# Altium footprint library En.PcbLib: 240 footprints (part 9 of 15)
Each footprint in its own frame and in the unit in brackets; x right, y up, seen from the top. Pads: shape width x height; smd on the part's side, far side on the other; paste and mask are expansions set on the pad; w line width, h text height; cw(c..) or ccw(c..) is an arc to the next point about the centre after c.
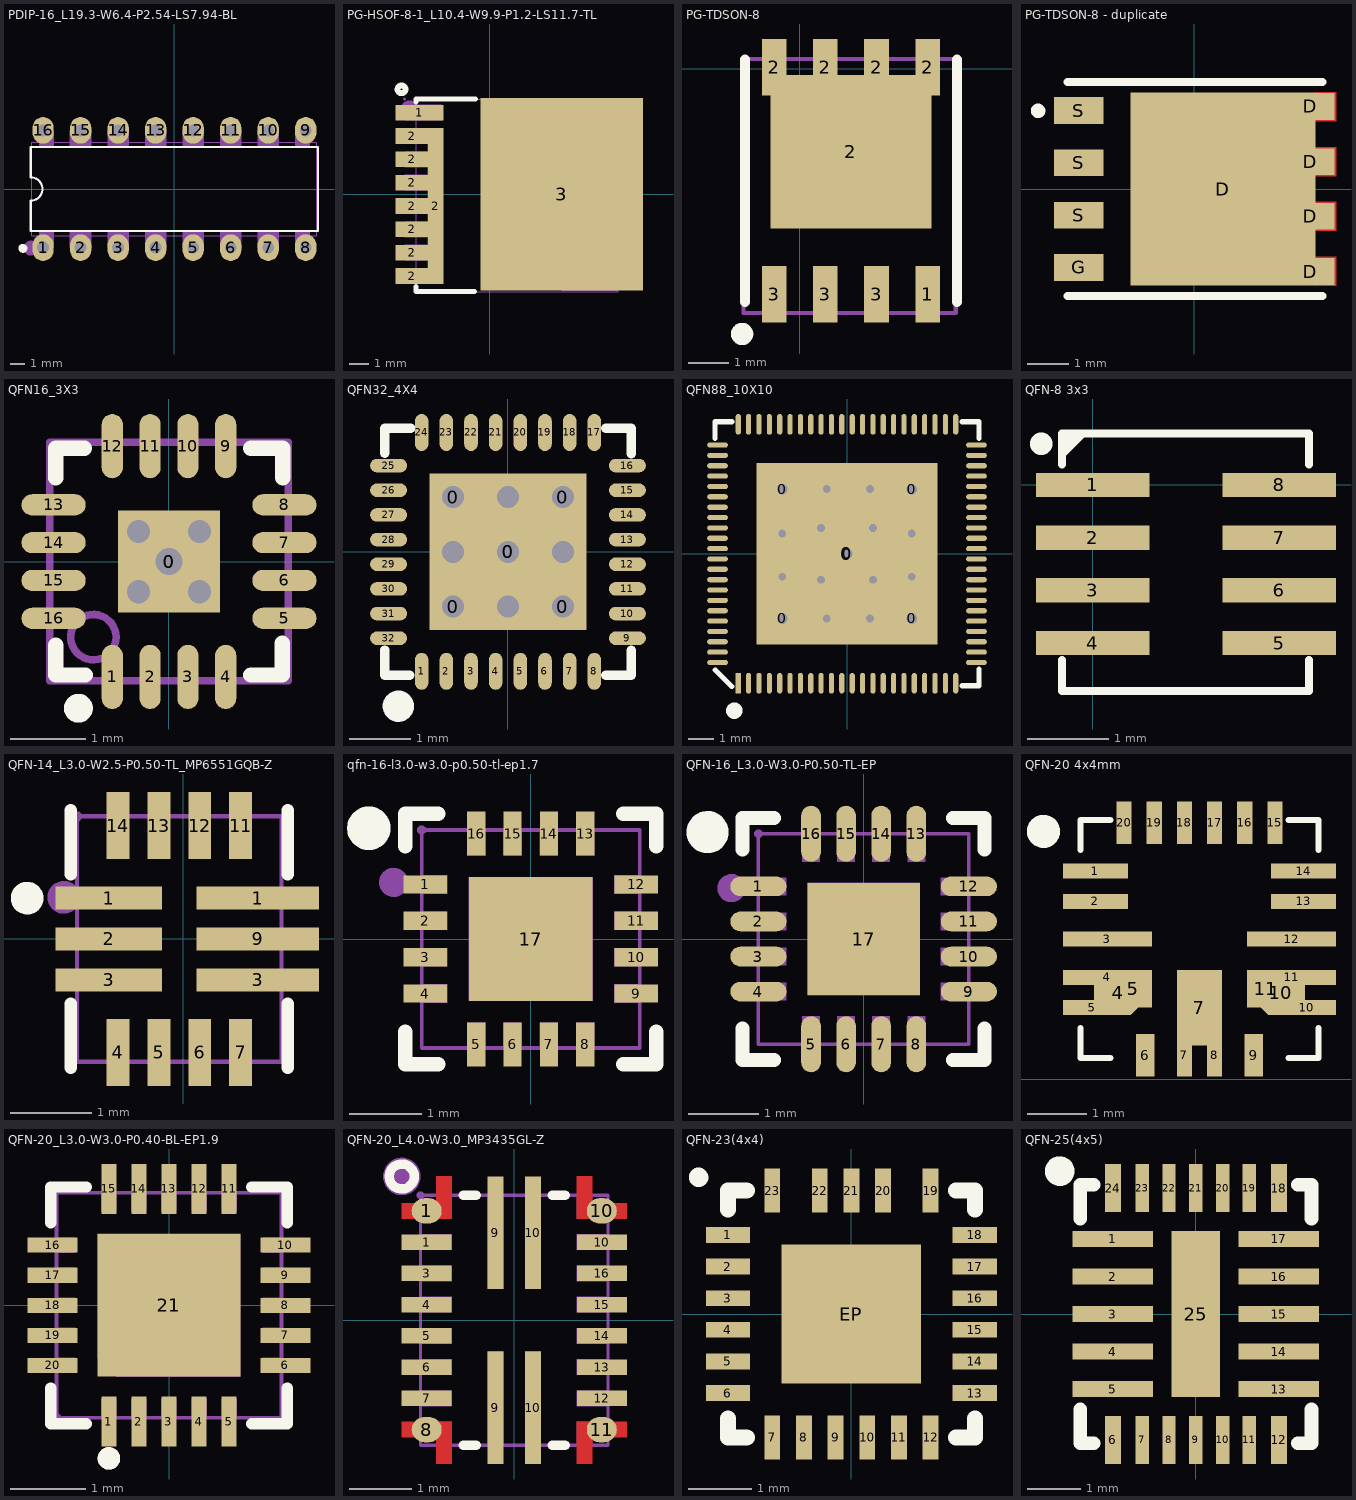
[diagram p8: the footprints below, top view; thin cyan lines are the x and y axes]

## PDIP-16_L19.3-W6.4-P2.54-LS7.94-BL [mm]
pads (16):
  oval 1.44x1.8 hole 0.8: 1(-8.89,-3.97) 2(-6.35,-3.97) 3(-3.81,-3.97) 4(-1.27,-3.97) 5(1.27,-3.97) 6(3.81,-3.97) 7(6.35,-3.97) 8(8.89,-3.97) 9(8.89,3.97) 10(6.35,3.97) 11(3.81,3.97) 12(1.27,3.97) 13(-1.27,3.97) 14(-3.81,3.97) 15(-6.35,3.97) 16(-8.89,3.97)
Top Overlay:
  circle w0.3: c-10.26,-4.02 r0.15
  lines w0.152: -9.729,-2.841 9.729,-2.841 9.729,2.841 -9.729,2.841 -9.729,0.794 cw(c-9.729,0) -9.729,-0.794 -9.729,-2.841
Mechanical 6:
  circle w0.5: c-9.71,-4 r0.25
Mechanical 15:
  drawing of 37 lines, arcs and shapes, not listed
3D body "sn74ls147n(lx).step": height 4.58, standoff -3.69, extent -9.65,-4.095 9.65,4.095

## PG-HSOF-8-1_L10.4-W9.9-P1.2-LS11.7-TL [mm]
pads (10):
  rect 2.463x0.8 smd paste-100 mask+0.051: 1(-3.619,4.2)
  rect 1.7x0.8 smd paste-100 mask+0.051: 2(-4,-4.2) 2(-4,-3) 2(-4,-1.8) 2(-4,-0.6) 2(-4,0.6) 2(-4,1.8) 2(-4,3)
  rect 0.8x8 smd paste-100 mask+0.051: 2(-2.788,-0.6)
  rect 8.382x9.9 smd paste-100 mask+0.051: 3(3.691,0)
Top Overlay:
  circle w0.3: c-4.55,5.4 r0.2
  lines w0.254: -3.8,-4.75 -3.8,-5 -0.8,-5 ; -3.8,4.75 -3.8,4.9 -0.75,4.9
Top Paste:
  region: -4.85,4.6 -2.4,4.6 -2.4,3.8 -4.85,3.8
  region: 8.5,4.95 8.5,-4.95 -0.5,-4.95 -0.5,4.95
  region: -4.85,3.4 -2.388,3.4 -2.388,-4.6 -4.85,-4.6 -4.85,-3.8 -3.187,-3.8 -3.187,-3.4 -4.85,-3.4 -4.85,-2.6 -3.188,-2.6 -3.188,-2.2 -4.85,-2.2 -4.85,-1.4 -3.187,-1.4 -3.187,-1 -4.85,-1 -4.85,-0.201 -4.85,-0.2 -3.187,-0.2 -3.187,0.2 -4.849,0.2 -4.85,0.201 -4.85,1 -3.187,1 -3.187,1.4 -4.85,1.4 -4.85,2.2 -3.187,2.2 -3.186,2.199 -3.186,2.598 -3.188,2.6 -4.85,2.6
Mechanical 6:
  circle w0.5: c-4.129,4.326 r0.25
Mechanical 15:
  region: -4.328,4.9 -4.328,4.925 -4.363,4.96 -4.413,4.96 -4.448,4.925 -4.448,4.9 -4.448,4.875 -4.413,4.84 -4.363,4.84 -4.328,4.875
  region: -4.388,3.8 -4.388,4.6 -2.488,4.6 -2.488,3.8
  region: -4.388,-4.6 -4.388,-3.8 -3.188,-3.8 -3.188,-4.6
  region: -4.388,-3.4 -4.388,-2.6 -3.188,-2.6 -3.188,-3.4
  region: -4.388,-2.2 -4.388,-1.4 -3.188,-1.4 -3.188,-2.2
  region: -4.388,0.2 -4.388,1 -3.188,1 -3.188,0.2
  region: -4.388,-1 -4.388,-0.2 -3.188,-0.2 -3.188,-1
  region: -4.388,1.4 -4.388,2.2 -3.188,2.2 -3.188,1.4
  region: -4.388,2.6 -4.388,3.4 -3.188,3.4 -3.188,2.6
  region: -3.188,3.4 -2.488,3.4 -2.488,-4.6 -3.188,-4.6
  region: 7.29,-4.9 7.29,-3.75 6.99,-3.75 6.99,-0.65 7.29,-0.65 7.29,0.65 6.99,0.65 6.99,3.75 7.29,3.75 7.29,4.9 3.69,4.9 3.69,4.55 0.39,4.55 0.39,-4.55 3.69,-4.55 3.69,-4.95 6.59,-4.95 6.59,-4.9
  lines w0.051: -3.8,-5.004 6.6,-5.004 6.6,4.896 -3.8,4.896 -3.8,-5.004
3D body "ipt020n10n5atma1.step": height 2.3, standoff -0.01, extent -4.263,-4.95 7.411,4.95

## PG-TDSON-8 [mm]
pads (9):
  rect 0.61x1.4 smd: 1(3.175,-5.588) 2(-0.635,0.044) 2(0.635,0.044) 2(1.905,0.044) 2(3.175,0.044) 3(-0.635,-5.588) 3(0.635,-5.588) 3(1.905,-5.588)
  rect 4x3.81 smd: 2(1.27,-2.056)
Top Overlay:
  circle w0.305: c-1.43,-6.572 r0.125
  lines w0.254: -1.36,-5.772 -1.36,0.228 ; 3.9,-5.772 3.9,0.228
Mechanical 13:
  lines w0.1: -1.39,-6.056 -1.39,0.244 3.87,0.244 3.87,-6.056 -1.39,-6.056
3D body "TDSON-8-1.stp": height 1.01, standoff 0, extent -1.425,-5.726 3.965,0.424

## PG-TDSON-8 - duplicate [mm]
pads (9):
  rect 4.5x4.7 smd: D(0.691,0)
  rect 1.2x0.65 smd: D(2.81,-2.007) D(2.81,-0.66) D(2.81,0.66) D(2.81,2.007) G(-2.809,-1.905) S(-2.809,-0.635) S(-2.809,0.635) S(-2.809,1.905)
Top Layer:
  region: 2.941,-0.315 2.941,-1.015 3.441,-1.015 3.441,-0.315
  region: 2.941,1.015 2.941,0.315 3.441,0.315 3.441,1.015
  region: 2.941,-1.65 2.941,-2.35 3.441,-2.35 3.441,-1.65
  region: 2.941,2.35 2.941,1.65 3.441,1.65 3.441,2.35
Top Overlay:
  circle w0.25: c-3.8,1.9 r0.05
  lines w0.2: -3.084,-2.6 3.116,-2.6 ; -3.084,2.6 3.116,2.6
3D body "TDSON-8-1.stp": height 1.01, standoff 0, extent -3.059,-2.695 3.091,2.695

## QFN16_3X3 [mm]
pads (18):
  rect 1.35x1.35 smd mask+0.051: 0(0,0)
  round 0.508 hole 0.356: 0(0,0)
  oval 0.28x0.85 smd mask+0.051: 1(-0.75,-1.526) 2(-0.25,-1.526) 3(0.25,-1.526) 4(0.75,-1.526) 9(0.75,1.526) 10(0.25,1.526) 11(-0.25,1.526) 12(-0.75,1.526)
  oval 0.85x0.28 smd mask+0.051: 5(1.526,-0.75) 6(1.526,-0.25) 7(1.526,0.25) 8(1.526,0.75) 13(-1.526,0.75) 14(-1.526,0.25) 15(-1.526,-0.25) 16(-1.526,-0.75)
via -0.405,-0.399 diameter 0.508 hole 0.305
via 0.405,-0.399 diameter 0.508 hole 0.305
via 0.405,0.399 diameter 0.508 hole 0.305
via -0.405,0.399 diameter 0.508 hole 0.305
Top Overlay:
  circle w0.229: c-1.198,-1.94 r0.076
  lines w0.203: -1.497,-1.108 -1.497,-1.5 -1.105,-1.5 ; -1.497,1.105 -1.497,1.5 -1.118,1.5 ; 1.079,-1.5 1.5,-1.5 1.5,-1.08 ; 1.082,1.5 1.503,1.5 1.503,1.108
Mechanical 13:
  circle w0.1: c-1,-1 r0.3
  lines w0.1: -1.575,-1.575 -1.575,1.575 1.575,1.575 1.575,-1.575 -1.575,-1.575
3D body: height 0.25, standoff 0, extent -1.521,-1.519 1.521,1.523

## QFN32_4X4 [mm]
pads (38):
  round 0.508 hole 0.356: 0(-0.889,-0.887) 0(-0.889,0.887) 0(0,0) 0(0.889,-0.887) 0(0.889,0.887)
  rect 2.54x2.54 smd mask+0.051: 0(0,0)
  oval 0.22x0.6 smd mask+0.051: 1(-1.4,-1.936) 2(-1,-1.936) 3(-0.6,-1.936) 4(-0.2,-1.936) 5(0.2,-1.936) 6(0.6,-1.936) 7(1,-1.936) 8(1.4,-1.936) 17(1.4,1.936) 18(1,1.936) 19(0.6,1.936) 20(0.2,1.936) 21(-0.2,1.936) 22(-0.6,1.936) 23(-1,1.936) 24(-1.4,1.936)
  oval 0.6x0.22 smd mask+0.051: 9(1.936,-1.4) 10(1.936,-1) 11(1.936,-0.6) 12(1.936,-0.2) 13(1.936,0.2) 14(1.936,0.6) 15(1.936,1) 16(1.936,1.4) 25(-1.936,1.4) 26(-1.936,1) 27(-1.936,0.6) 28(-1.936,0.2) 29(-1.936,-0.2) 30(-1.936,-0.6) 31(-1.936,-1) 32(-1.936,-1.4)
via 0.889,0 diameter 0.508 hole 0.356
via 0,-0.887 diameter 0.508 hole 0.356
via -0.889,0 diameter 0.508 hole 0.356
via 0,0.887 diameter 0.508 hole 0.356
Top Overlay:
  circle w0.254: c-1.78,-2.502 r0.127
  lines w0.152: -2.001,-1.591 -2.001,-1.998 -1.595,-1.998 ; -2.001,1.602 -2.001,2.002 -1.574,2.002 ; 1.583,2.002 1.999,2.002 1.999,1.59 ; 1.585,-1.998 1.999,-1.998 1.999,-1.593
3D body "hc32l130f8ua-qfn32tr.step": height 0.84, standoff -0.02, extent -2.01,-2.01 2.01,2.01

## QFN88_10X10 [mm]
pads (94):
  round 0.711 hole 0.406 mask+0.051: 0(-2.5,-2.5) 0(-2.5,2.5) 0(0,0) 0(2.5,-2.5) 0(2.5,2.5)
  rect 7x7 smd mask+0.051: 0(0,0)
  rect 0.2x0.8 smd mask+0.051: 1(-4.2,-5)
  oval 0.2x0.8 smd mask+0.051: 2(-3.8,-5) 3(-3.4,-5) 4(-3,-5) 5(-2.6,-5) 6(-2.2,-5) 7(-1.8,-5) 8(-1.4,-5) 9(-1,-5) 10(-0.6,-5) 11(-0.2,-5) 12(0.2,-5) 13(0.6,-5) 14(1,-5) 15(1.4,-5) 16(1.8,-5) 17(2.2,-5) 18(2.6,-5) 19(3,-5) 20(3.4,-5) 21(3.8,-5) 22(4.2,-5) 45(4.2,5) 46(3.8,5) 47(3.4,5) 48(3,5) 49(2.6,5) 50(2.2,5) 51(1.8,5) 52(1.4,5) 53(1,5) 54(0.6,5) 55(0.2,5) 56(-0.2,5) 57(-0.6,5) 58(-1,5) 59(-1.4,5) 60(-1.8,5) 61(-2.2,5) 62(-2.6,5) 63(-3,5) 64(-3.4,5) 65(-3.8,5) 66(-4.2,5)
  oval 0.8x0.2 smd mask+0.051: 23(5,-4.2) 24(5,-3.8) 25(5,-3.4) 26(5,-3) 27(5,-2.6) 28(5,-2.2) 29(5,-1.8) 30(5,-1.4) 31(5,-1) 32(5,-0.6) 33(5,-0.2) 34(5,0.2) 35(5,0.6) 36(5,1) 37(5,1.4) 38(5,1.8) 39(5,2.2) 40(5,2.6) 41(5,3) 42(5,3.4) 43(5,3.8) 44(5,4.2) 67(-5,4.2) 68(-5,3.8) 69(-5,3.4) 70(-5,3) 71(-5,2.6) 72(-5,2.2) 73(-5,1.8) 74(-5,1.4) 75(-5,1) 76(-5,0.6) 77(-5,0.2) 78(-5,-0.2) 79(-5,-0.6) 80(-5,-1) 81(-5,-1.4) 82(-5,-1.8) 83(-5,-2.2) 84(-5,-2.6) 85(-5,-3) 86(-5,-3.4) 87(-5,-3.8) 88(-5,-4.2)
via 1,1 diameter 0.6 hole 0.3
via 1,-1 diameter 0.6 hole 0.3
via -1,-1 diameter 0.6 hole 0.3
via -1,1 diameter 0.6 hole 0.3
via -0.783,2.5 diameter 0.6 hole 0.3
via 2.5,0.783 diameter 0.6 hole 0.3
via 2.5,-0.884 diameter 0.6 hole 0.3
via -2.5,0.783 diameter 0.6 hole 0.3
via 0.884,2.5 diameter 0.6 hole 0.3
via -2.5,-0.884 diameter 0.6 hole 0.3
via -0.783,-2.5 diameter 0.6 hole 0.3
via 0.884,-2.5 diameter 0.6 hole 0.3
Top Overlay:
  circle w0.381: c-4.352,-6.062 r0.127
  lines w0.2: -5.1,4.45 -5.1,5.1 -4.45,5.1 ; 4.45,-5.1 5.1,-5.1 5.1,-4.45 ; 4.45,5.1 5.1,5.1 5.1,4.45
  lines w0.203: -5.089,-4.492 -4.454,-5.127
3D body "f1c200s.step": height 0.75, standoff 0, extent -5,-5 5,5

## QFN-8 3x3 [mm]
pads (8):
  rect 1.4x0.3 smd: 1(0,0) 2(0,-0.65) 3(0,-1.3) 4(0,-1.95) 5(2.3,-1.95) 6(2.3,-1.3) 7(2.3,-0.65) 8(2.3,0)
Top Overlay:
  circle w0.254: c-0.635,0.508 r0.01
  lines w0.1: -0.381,-2.159 -0.381,-2.54 2.667,-2.54 2.667,-2.159 ; -0.381,0.254 -0.381,0.635 2.667,0.635 2.667,0.254 ; -0.381,0.381 -0.127,0.635 ; -0.381,0.508 -0.254,0.635
3D body "QFN-3x3_MP4423A_MNP.step": height 0.94, standoff 0, extent -0.406,-2.529 2.692,0.569

## QFN-14_L3.0-W2.5-P0.50-TL_MP6551GQB-Z [mm]
pads (14):
  rect 1.3x0.28 smd paste+0 mask+0.05: 1(-0.91,0.5) 2(-0.91,0) 3(-0.91,-0.5)
  rect 1.5x0.28 smd paste+0 mask+0.05: 1(0.91,0.5) 3(0.91,-0.5) 9(0.91,0)
  rect 0.28x0.825 smd paste+0 mask+0.05: 4(-0.798,-1.388) 5(-0.297,-1.388) 6(0.202,-1.388) 7(0.703,-1.388) 11(0.703,1.388) 12(0.202,1.388) 13(-0.297,1.388) 14(-0.798,1.388)
Top Overlay:
  circle w0.2: c-1.908,0.5 r0.1
  lines w0.152: -1.374,-1.576 -1.374,-0.792 ; -1.374,0.792 -1.374,1.576 ; 1.279,-1.576 1.279,-0.792 ; 1.279,0.792 1.279,1.576
Mechanical 6:
  circle w0.2: c-1.46,0.51 r0.1
Mechanical 15:
  region: -1.297,0.375 -0.397,0.375 -0.397,0.625 -1.297,0.625
  region: -0.922,-1.5 -0.672,-1.5 -0.672,-1 -0.922,-1
  region: -0.422,-1.5 -0.172,-1.5 -0.172,-1 -0.422,-1
  region: 0.078,-1.5 0.328,-1.5 0.328,-1 0.078,-1
  region: 0.578,-1.5 0.828,-1.5 0.828,-1 0.578,-1
  region: 1.202,0.375 0.203,0.375 0.203,0.625 1.202,0.625
  region: 0.577,1.5 0.827,1.5 0.827,1 0.577,1
  region: 0.078,1.5 0.327,1.5 0.328,1 0.078,1
  region: -0.422,1.5 -0.172,1.5 -0.172,1 -0.422,1
  region: -0.922,1.5 -0.672,1.5 -0.672,1 -0.922,1
  region: 1.203,-0.125 0.203,-0.125 0.203,0.125 1.203,0.125
  region: 1.203,-0.625 0.203,-0.625 0.203,-0.375 1.203,-0.375
  region: -0.298,-0.125 -1.298,-0.125 -1.298,0.125 -0.298,0.125
  region: -0.298,-0.625 -1.298,-0.625 -1.298,-0.375 -0.298,-0.375
  region: -1.237,1.5 -1.238,1.524 -1.273,1.559 -1.322,1.559 -1.357,1.524 -1.357,1.5 -1.357,1.475 -1.322,1.441 -1.273,1.441 -1.238,1.475
  lines w0.051: -1.297,-1.5 1.202,-1.5 1.202,1.5 -1.297,1.5 -1.297,-1.5
3D body "mp6551gqb-z.step": height 0.87, standoff -0.03, extent -1.25,-1.51 1.25,1.5

## qfn-16-l3.0-w3.0-p0.50-tl-ep1.7 [mm]
pads (17):
  rect 0.6x0.25 smd: 1(-1.45,0.75) 2(-1.45,0.25) 3(-1.45,-0.25) 4(-1.45,-0.75) 9(1.45,-0.75) 10(1.45,-0.25) 11(1.45,0.25) 12(1.45,0.75)
  rect 0.25x0.6 smd: 5(-0.75,-1.45) 6(-0.25,-1.45) 7(0.25,-1.45) 8(0.75,-1.45) 13(0.75,1.45) 14(0.25,1.45) 15(-0.25,1.45) 16(-0.75,1.45)
  rect 1.7x1.7 smd: 17(0,0)
Top Overlay:
  lines w0.2: -1.725,-1.275 -1.725,-1.725 -1.275,-1.725 ; -1.725,1.275 -1.725,1.725 -1.275,1.725 ; 1.275,-1.725 1.725,-1.725 1.725,-1.275 ; 1.275,1.725 1.725,1.725 1.725,1.275
  lines w0.3: -2.075,1.521 cw(c-2.225,1.523) -2.375,1.523 cw(c-2.225,1.523) -2.075,1.524
Mechanical 6:
  circle w0.2: c-1.885,0.778 r0.1
Mechanical 15:
  region: -1.491,0.625 -1.491,0.875 -1.151,0.875 -1.151,0.625
  region: -1.491,0.125 -1.491,0.375 -1.151,0.375 -1.151,0.125
  region: -1.491,-0.375 -1.491,-0.125 -1.151,-0.125 -1.151,-0.375
  region: -1.491,-0.875 -1.491,-0.625 -1.151,-0.625 -1.151,-0.875
  region: -0.625,-1.491 -0.875,-1.491 -0.875,-1.151 -0.625,-1.151
  region: -0.125,-1.491 -0.375,-1.491 -0.375,-1.151 -0.125,-1.151
  region: 0.375,-1.491 0.125,-1.491 0.125,-1.151 0.375,-1.151
  region: 0.875,-1.491 0.625,-1.491 0.625,-1.151 0.875,-1.151
  region: 1.491,-0.625 1.491,-0.875 1.151,-0.875 1.151,-0.625
  region: 1.491,-0.125 1.491,-0.375 1.151,-0.375 1.151,-0.125
  region: 1.491,0.375 1.491,0.125 1.151,0.125 1.151,0.375
  region: 1.491,0.875 1.491,0.625 1.151,0.625 1.151,0.875
  region: 0.625,1.491 0.875,1.491 0.875,1.151 0.625,1.151
  region: 0.125,1.491 0.375,1.491 0.375,1.151 0.125,1.151
  region: -0.375,1.491 -0.125,1.491 -0.125,1.151 -0.375,1.151
  region: -0.85,0.85 0.85,0.85 0.85,-0.85 -0.85,-0.85
  region: -0.875,1.491 -0.625,1.491 -0.625,1.151 -0.875,1.151
  region: -1.439,1.5 -1.44,1.525 -1.475,1.559 -1.524,1.559 -1.559,1.525 -1.559,1.5 -1.559,1.475 -1.524,1.44 -1.475,1.44 -1.44,1.475
  lines w0.051: -1.5,-1.5 -1.5,1.5 1.5,1.5 1.5,-1.5 -1.5,-1.5
3D body "QFN-16_MA600_MNP.step": height 0.94, standoff 0, extent -1.549,-1.549 1.549,1.549

## QFN-16_L3.0-W3.0-P0.50-TL-EP [mm]
pads (17):
  oval 0.8x0.28 smd: 1(-1.5,0.75) 2(-1.5,0.25) 3(-1.5,-0.25) 4(-1.5,-0.75) 9(1.5,-0.75) 10(1.5,-0.25) 11(1.5,0.25) 12(1.5,0.75)
  oval 0.28x0.8 smd: 5(-0.75,-1.5) 6(-0.25,-1.5) 7(0.25,-1.5) 8(0.75,-1.5) 13(0.75,1.5) 14(0.25,1.5) 15(-0.25,1.5) 16(-0.75,1.5)
  rect 1.6x1.6 smd: 17(0,0)
Top Overlay:
  lines w0.2: -1.725,-1.275 -1.725,-1.725 -1.275,-1.725 ; -1.725,1.275 -1.725,1.725 -1.275,1.725 ; 1.275,-1.725 1.725,-1.725 1.725,-1.275 ; 1.275,1.725 1.725,1.725 1.725,1.275
  lines w0.3: -2.075,1.521 cw(c-2.225,1.523) -2.375,1.523 cw(c-2.225,1.523) -2.075,1.524
Mechanical 6:
  circle w0.2: c-1.885,0.725 r0.1
Mechanical 15:
  region: -0.8,0.8 0.8,0.8 0.8,-0.8 -0.8,-0.8
  region: -1.1,0.875 -1.1,0.625 -1.5,0.625 -1.5,0.875
  region: -1.1,0.375 -1.1,0.125 -1.5,0.125 -1.5,0.375
  region: -1.1,-0.125 -1.1,-0.375 -1.5,-0.375 -1.5,-0.125
  region: -1.1,-0.625 -1.1,-0.875 -1.5,-0.875 -1.5,-0.625
  region: -0.875,-1.1 -0.625,-1.1 -0.625,-1.5 -0.875,-1.5
  region: -0.375,-1.1 -0.125,-1.1 -0.125,-1.5 -0.375,-1.5
  region: 0.125,-1.1 0.375,-1.1 0.375,-1.5 0.125,-1.5
  region: 0.625,-1.1 0.875,-1.1 0.875,-1.5 0.625,-1.5
  region: 1.5,-0.625 1.5,-0.875 1.1,-0.875 1.1,-0.625
  region: 1.5,-0.125 1.5,-0.375 1.1,-0.375 1.1,-0.125
  region: 1.5,0.375 1.5,0.125 1.1,0.125 1.1,0.375
  region: 1.5,0.875 1.5,0.625 1.1,0.625 1.1,0.875
  region: 0.625,1.5 0.875,1.5 0.875,1.1 0.625,1.1
  region: 0.125,1.5 0.375,1.5 0.375,1.1 0.125,1.1
  region: -0.375,1.5 -0.125,1.5 -0.125,1.1 -0.375,1.1
  region: -0.875,1.5 -0.625,1.5 -0.625,1.1 -0.875,1.1
  region: -1.439,1.5 -1.439,1.525 -1.475,1.56 -1.524,1.56 -1.559,1.525 -1.559,1.5 -1.559,1.475 -1.524,1.44 -1.474,1.44 -1.439,1.475
  lines w0.051: -1.5,-1.5 -1.5,1.5 1.5,1.5 1.5,-1.5 -1.5,-1.5
3D body "tp4586.step": height 0.44, standoff 0.01, extent -1.51,-1.51 1.51,1.51

## QFN-20 4x4mm [mil]
pads (25):
  rect 43x10 smd: 1(51,138) 2(51,118) 13(189,118) 14(189,138)
  rect 59x10 smd: 3(59,93) 4(59,67.5) 11(181,67.5) 12(181,93)
  oct 32x30 smd: 4(66,57.5) 10(174,57.5)
  rect 39x10 smd: 5(49,47.5) 10(191,47.5)
  rect 25x25 smd: 5(76,60) 11(164,60)
  rect 12x28 smd: 6(84,16) 9(156,16)
  rect 10x28 smd: 7(110,16) 8(130,16) 15(170,170) 16(150,170) 17(130,170) 18(110,170) 19(90,170) 20(70,170)
  rect 30x50 smd: 7(120,47.5)
Top Overlay:
  circle w12: c16.6,164.3 r5
  lines w4: 41,34 41,14 61,14 ; 41,152 41,172 61,172 ; 179,14 199,14 199,34 ; 179,172 199,172 199,152
3D body "MP4312GRE.step": height 33.53, standoff 0.06, extent 40.79,14.67 198.27,172.15

## QFN-20_L3.0-W3.0-P0.40-BL-EP1.9 [mm]
pads (21):
  rect 0.2x0.665 smd paste-100 mask+0.05: 1(-0.8,-1.55) 2(-0.4,-1.55) 3(0,-1.55) 4(0.4,-1.55) 5(0.8,-1.55) 11(0.8,1.55) 12(0.4,1.55) 13(0,1.55) 14(-0.4,1.55) 15(-0.8,1.55)
  rect 0.665x0.2 smd paste-100 mask+0.05: 6(1.55,-0.8) 7(1.55,-0.4) 8(1.55,0) 9(1.55,0.4) 10(1.55,0.8) 16(-1.55,0.8) 17(-1.55,0.4) 18(-1.55,0) 19(-1.55,-0.4) 20(-1.55,-0.8)
  rect 1.9x1.9 smd paste-100 mask+0.05: 21(0,0)
Top Overlay:
  circle w0.15: c-0.8,-2.04 r0.075
  lines w0.152: -1.576,-1.102 -1.576,-1.576 -1.103,-1.576 ; -1.576,1.103 -1.576,1.576 -1.103,1.576 ; 1.102,-1.576 1.576,-1.576 1.576,-1.102 ; 1.102,1.576 1.576,1.576 1.576,1.103
Top Paste:
  region: -0.76,0.76 0.76,0.76 0.76,-0.76 -0.76,-0.76
  region: -0.3,-1.882 -0.3,-1.217 -0.5,-1.217 -0.5,-1.882
  region: 0.1,-1.882 0.1,-1.217 -0.1,-1.217 -0.1,-1.882
  region: 0.5,-1.882 0.5,-1.217 0.3,-1.217 0.3,-1.882
  region: 0.7,-1.217 0.7,-1.882 0.9,-1.882 0.9,-1.217
  region: -0.9,-1.217 -0.9,-1.882 -0.7,-1.882 -0.7,-1.217
  region: 1.882,-0.9 1.882,-0.7 1.217,-0.7 1.217,-0.9
  region: -1.883,-0.7 -1.883,-0.9 -1.218,-0.9 -1.218,-0.7
  region: 1.882,-0.5 1.882,-0.3 1.217,-0.3 1.217,-0.5
  region: -1.218,-0.5 -1.218,-0.3 -1.883,-0.3 -1.883,-0.5
  region: 1.882,-0.1 1.882,0.1 1.217,0.1 1.217,-0.1
  region: -1.218,-0.1 -1.218,0.1 -1.883,0.1 -1.883,-0.1
  region: 1.882,0.3 1.882,0.5 1.217,0.5 1.217,0.3
  region: -1.218,0.3 -1.218,0.5 -1.883,0.5 -1.883,0.3
  region: 1.882,0.7 1.882,0.9 1.217,0.9 1.217,0.7
  region: -1.883,0.9 -1.883,0.7 -1.218,0.7 -1.218,0.9
  region: -0.9,1.883 -0.9,1.218 -0.7,1.218 -0.7,1.883
  region: -0.5,1.883 -0.5,1.218 -0.3,1.218 -0.3,1.883
  region: -0.1,1.883 -0.1,1.218 0.1,1.218 0.1,1.883
  region: 0.3,1.883 0.3,1.218 0.5,1.218 0.5,1.883
  region: 0.7,1.883 0.7,1.218 0.9,1.218 0.9,1.883
Mechanical 6:
  circle w0.15: c-0.8,-2.04 r0.075
Mechanical 15:
  region: -0.9,-1.5 -0.9,-1.25 -0.7,-1.25 -0.7,-1.5
  region: -0.5,-1.5 -0.5,-1.25 -0.3,-1.25 -0.3,-1.5
  region: -0.1,-1.5 -0.1,-1.25 0.1,-1.25 0.1,-1.5
  region: 0.3,-1.5 0.3,-1.25 0.5,-1.25 0.5,-1.5
  region: 0.7,-1.5 0.7,-1.25 0.9,-1.25 0.9,-1.5
  region: 1.25,-0.9 1.25,-0.7 1.5,-0.7 1.5,-0.9
  region: 1.25,-0.5 1.25,-0.3 1.5,-0.3 1.5,-0.5
  region: 1.25,-0.1 1.25,0.1 1.5,0.1 1.5,-0.1
  region: 1.25,0.3 1.25,0.5 1.5,0.5 1.5,0.3
  region: 1.25,0.7 1.25,0.9 1.5,0.9 1.5,0.7
  region: 0.7,1.25 0.7,1.5 0.9,1.5 0.9,1.25
  region: 0.3,1.25 0.3,1.5 0.5,1.5 0.5,1.25
  region: -0.1,1.25 -0.1,1.5 0.1,1.5 0.1,1.25
  region: -0.5,1.25 -0.5,1.5 -0.3,1.5 -0.3,1.25
  region: -0.9,1.25 -0.9,1.5 -0.7,1.5 -0.7,1.25
  region: -1.5,0.7 -1.5,0.9 -1.25,0.9 -1.25,0.7
  region: -1.5,0.3 -1.5,0.5 -1.25,0.5 -1.25,0.3
  region: -1.5,-0.1 -1.5,0.1 -1.25,0.1 -1.25,-0.1
  region: -1.5,-0.5 -1.5,-0.3 -1.25,-0.3 -1.25,-0.5
  region: -1.5,-0.9 -1.5,-0.7 -1.25,-0.7 -1.25,-0.9
  region: -0.95,-0.7 -0.95,0.95 0.95,0.95 0.95,-0.95 -0.7,-0.95
  region: -1.44,-1.5 -1.44,-1.475 -1.475,-1.44 -1.525,-1.44 -1.56,-1.475 -1.56,-1.5 -1.56,-1.525 -1.525,-1.56 -1.475,-1.56 -1.44,-1.525
  lines w0.051: -1.5,-1.5 1.5,-1.5 1.5,1.5 -1.5,1.5 -1.5,-1.5
3D body "tmi7003c.step": height 0.82, standoff 0, extent -1.51,-1.51 1.51,1.51

## QFN-20_L4.0-W3.0_MP3435GL-Z [mm]
pads (20):
  oval 0.48x0.405 smd: 1(-1.4,1.75) 8(-1.4,-1.75) 10(1.4,1.75) 11(1.4,-1.75)
  rect 0.8x0.25 smd paste+0 mask+0.05: 1(-1.4,1.25) 3(-1.4,0.75) 4(-1.4,0.25) 5(-1.4,-0.25) 6(-1.4,-0.75) 7(-1.4,-1.25) 10(1.4,1.25) 12(1.4,-1.25) 13(1.4,-0.75) 14(1.4,-0.25) 15(1.4,0.25) 16(1.4,0.75)
  rect 0.25x1.8 smd paste+0 mask+0.05: 9(-0.3,-1.4) 9(-0.3,1.4) 10(0.3,1.4) 10(0.3,-1.4)
Top Layer:
  region: 1,1.875 1,2.3 1.25,2.3 1.25,1.875 1.8,1.875 1.8,1.625 1,1.625 1,1.875
  region: 1,-1.875 1,-1.625 1.8,-1.625 1.8,-1.875 1.25,-1.875 1.25,-2.3 1,-2.3
  region: -1,-1.875 -1,-2.3 -1.25,-2.3 -1.25,-1.875 -1.8,-1.875 -1.8,-1.625 -1,-1.625 -1,-1.875
  region: -1,1.875 -1,1.625 -1.8,1.625 -1.8,1.875 -1.25,1.875 -1.25,2.3 -1,2.3
Top Overlay:
  circle w0.152: c-1.8,2.3 r0.2
  lines w0.152: -0.82,-2 -0.605,-2 ; -0.82,2 -0.605,2 ; 0.605,-2 0.82,-2 ; 0.605,2 0.82,2
Mechanical 6:
  circle w0.3: c-1.8,2.3 r0.15
Mechanical 15:
  region: -1.44,2 -1.441,2.024 -1.476,2.059 -1.525,2.059 -1.56,2.024 -1.56,2 -1.56,1.975 -1.525,1.941 -1.476,1.941 -1.441,1.976
  region: 1.5,1.375 1,1.375 1,1.125 1.5,1.125
  region: 1,2 1.25,2 1.25,1.875 1.5,1.875 1.5,1.625 1,1.625
  region: 1.5,0.875 1,0.875 1,0.625 1.5,0.625
  region: 1.5,0.375 1,0.375 1,0.125 1.5,0.125
  region: 1.5,-0.125 1,-0.125 1,-0.375 1.5,-0.375
  region: 1.5,-0.625 1,-0.625 1,-0.875 1.5,-0.875
  region: 1.5,-1.125 1,-1.125 1,-1.375 1.5,-1.375
  region: 1,-2 1.25,-2 1.25,-1.875 1.5,-1.875 1.5,-1.625 1,-1.625
  region: -0.425,-0.5 -0.175,-0.5 -0.175,-2 -0.425,-2
  region: 0.175,-0.5 0.425,-0.5 0.425,-2 0.175,-2
  region: 0.175,2 0.425,2 0.425,0.5 0.175,0.5
  region: -1,-2 -1.25,-2 -1.25,-1.875 -1.5,-1.875 -1.5,-1.625 -1,-1.625
  region: -1.5,-1.125 -1,-1.125 -1,-1.375 -1.5,-1.375
  region: -1.5,-0.625 -1,-0.625 -1,-0.875 -1.5,-0.875
  region: -1.5,-0.125 -1,-0.125 -1,-0.375 -1.5,-0.375
  region: -1.5,0.375 -1,0.375 -1,0.125 -1.5,0.125
  region: -1.5,0.875 -1,0.875 -1,0.625 -1.5,0.625
  region: -1,2 -1.25,2 -1.25,1.875 -1.5,1.875 -1.5,1.625 -1,1.625
  region: -1.5,1.375 -1,1.375 -1,1.125 -1.5,1.125
  region: -0.425,2 -0.175,2 -0.175,0.5 -0.425,0.5
  lines w0.051: -1.5,-2 1.5,-2 1.5,2 -1.5,2 -1.5,-2
3D body "MP3435GL.step": height 0.9, standoff 0, extent -1.496,-1.994 1.504,2.006

## QFN-23(4x4) [mm]
pads (24):
  rect 0.7x0.25 smd: 1(-1.95,1.25) 2(-1.95,0.75) 3(-1.95,0.25) 4(-1.95,-0.25) 5(-1.95,-0.75) 6(-1.95,-1.25) 13(1.95,-1.25) 14(1.95,-0.75) 15(1.95,-0.25) 16(1.95,0.25) 17(1.95,0.75) 18(1.95,1.25)
  rect 0.25x0.7 smd: 7(-1.25,-1.95) 8(-0.75,-1.95) 9(-0.25,-1.95) 10(0.25,-1.95) 11(0.75,-1.95) 12(1.25,-1.95) 19(1.25,1.95) 20(0.5,1.95) 21(0,1.95) 22(-0.5,1.95) 23(-1.25,1.95)
  rect 2.2x2.2 smd: EP(0,0)
Top Overlay:
  circle w0.254: c-2.413,2.159 r0.025
  lines w0.254: -1.95,-1.652 -1.95,-1.778 -1.95,-1.95 -1.778,-1.95 -1.652,-1.95 ; -1.95,1.652 -1.95,1.778 -1.95,1.95 -1.778,1.95 -1.652,1.95 ; 1.652,-1.95 1.778,-1.95 1.95,-1.95 1.95,-1.778 1.95,-1.652 ; 1.652,1.95 1.778,1.95 1.95,1.95 1.95,1.778 1.95,1.652
3D body "QFN-4x4_MP6526_MNP.step": height 0.94, standoff 0, extent -2.045,-2.045 2.045,2.045

## QFN-25(4x5) [mm]
pads (25):
  rect 1.5x0.3 smd: 1(-1.55,1.4) 2(-1.55,0.7) 3(-1.55,0) 4(-1.55,-0.7) 5(-1.55,-1.4) 13(1.55,-1.4) 14(1.55,-0.7) 15(1.55,0) 16(1.55,0.7) 17(1.55,1.4)
  rect 0.3x0.9 smd: 6(-1.55,-2.35) 12(1.55,-2.35) 18(1.55,2.35) 24(-1.55,2.35)
  rect 0.25x0.9 smd: 7(-1,-2.35) 8(-0.5,-2.35) 9(0,-2.35) 10(0.5,-2.35) 11(1,-2.35) 19(1,2.35) 20(0.5,2.35) 21(0,2.35) 22(-0.5,2.35) 23(-1,2.35)
  rect 0.9x3.1 smd: 25(0,0)
Top Overlay:
  circle w0.3: c-2.54,2.667 r0.127
  lines w0.254: -2.159,-1.778 -2.159,-2.413 -1.905,-2.413 ; -2.159,1.778 -2.159,2.413 -1.905,2.413 ; 1.905,-2.413 2.159,-2.413 2.159,-1.778 ; 1.905,2.413 2.159,2.413 2.159,1.778
3D body "MP6602GV.step": height 0.9, standoff 0, extent -1.999,-2.49 2.001,2.51